# Altium footprint library Inductance.PcbLib: 42 footprints (part 1 of 3)
Each footprint in its own frame and in the unit in brackets; x right, y up, seen from the top. Pads: shape width x height; smd on the part's side, far side on the other; paste and mask are expansions set on the pad; w line width, h text height; cw(c..) or ccw(c..) is an arc to the next point about the centre after c.
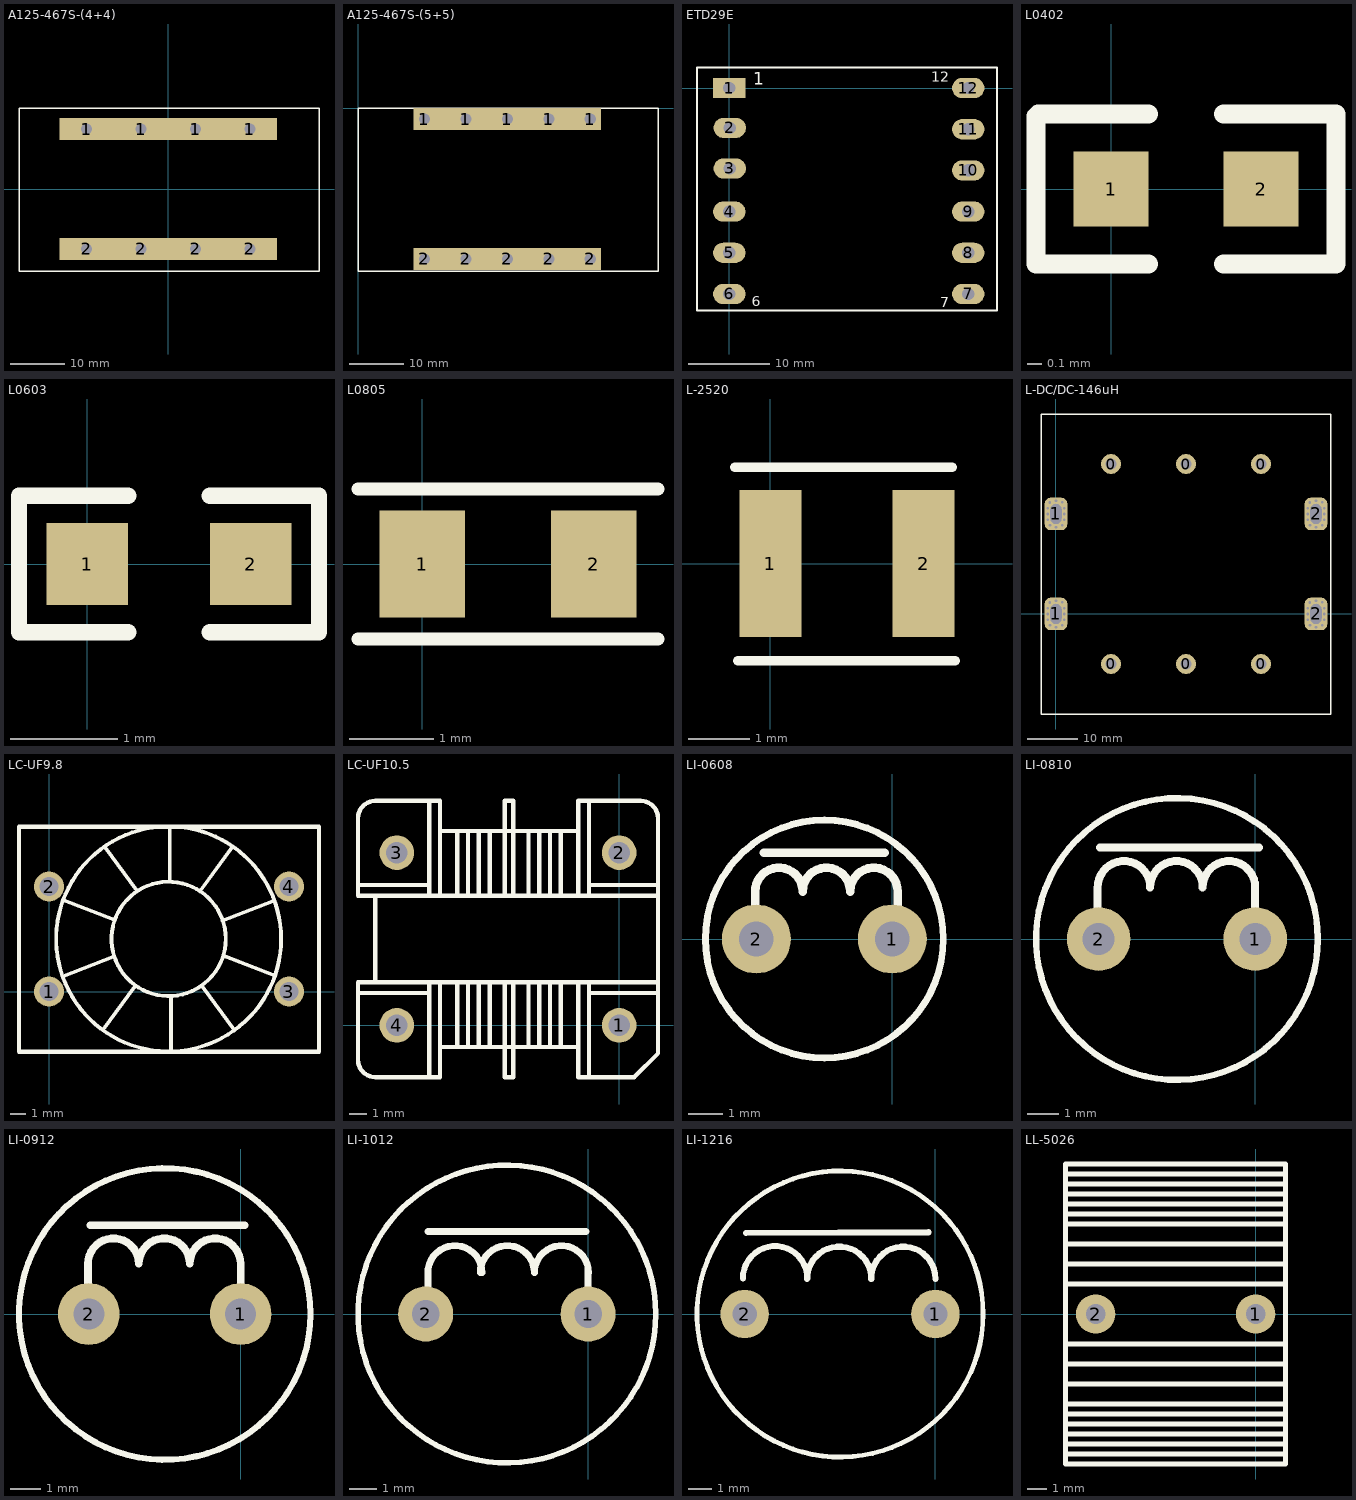
[diagram p0: the footprints below, top view; thin cyan lines are the x and y axes]

## A125-467S-(4+4) [mm]
pads (8):
  rect 10x4.064 hole 2.032: 1(-15,11) 1(-5,11) 1(5,11) 1(15,11) 2(-15,-11) 2(-5,-11) 2(5,-11) 2(15,-11)
Top Overlay:
  lines w0.254: -27.432,-15.113 -27.432,14.859 27.686,14.859 27.686,-15.113 -27.432,-15.113
3D body: height 8, standoff -2, extent -15.597,-11.597 -14.402,-10.399
3D body: height 8, standoff -2, extent -5.615,-11.572 -4.42,-10.374
3D body: height 8, standoff -2, extent 4.393,-11.597 5.588,-10.399
3D body: height 8, standoff -2, extent 14.426,-11.572 15.621,-10.374
3D body: height 8, standoff -2, extent 14.388,10.414 15.584,11.612
3D body: height 8, standoff -2, extent 4.406,10.439 5.601,11.637
3D body: height 8, standoff -2, extent -5.627,10.414 -4.432,11.612
3D body: height 8, standoff -2, extent -15.597,10.399 -14.402,11.597
3D body: height 50.8, standoff 1, extent -24.697,-13.903 25.205,14.097

## A125-467S-(5+5) [mil]
pads (10):
  rect 300x160 hole 80 copper offset 70.87,0: 1(480,-80) 2(480,-1090)
  rect 300x160 hole 80: 1(780,-80) 1(1080,-80) 1(1380,-80) 2(780,-1090) 2(1080,-1090) 2(1380,-1090)
  rect 300x160 hole 80 copper offset -70.87,0: 1(1680,-80) 2(1680,-1090)
Top Overlay:
  lines w10: 0,-1180 2170,-1180 2170,0 0,0 0,-1180
3D body: height 2000.11, standoff 39.37, extent 107.69,-1132.36 2072.31,-30
3D body: height 314.96, standoff -78.74, extent 456.57,-103.57 503.63,-56.42
3D body: height 314.96, standoff -78.74, extent 756.57,-103.57 803.63,-56.42
3D body: height 314.96, standoff -78.74, extent 1056.57,-103.57 1103.63,-56.42
3D body: height 314.96, standoff -78.74, extent 1356.57,-103.57 1403.63,-56.42
3D body: height 314.96, standoff -78.74, extent 1656.57,-103.57 1703.63,-56.42
3D body: height 314.96, standoff -78.74, extent 456.57,-1113.57 503.63,-1066.42
3D body: height 314.96, standoff -78.74, extent 756.57,-1113.57 803.63,-1066.42
3D body: height 314.96, standoff -78.74, extent 1056.57,-1113.57 1103.63,-1066.42
3D body: height 314.96, standoff -78.74, extent 1356.57,-1113.57 1403.63,-1066.42
3D body: height 314.96, standoff -78.74, extent 1656.57,-1113.57 1703.63,-1066.42

## ETD29E [mm]
pads (12):
  rect 4x2.5 hole 1.524: 1(0,0)
  oval 4x2.5 hole 1.524: 2(0.064,-4.92) 3(0.064,-9.92) 4(0,-15.24) 5(0,-20.32) 6(0,-25.4) 7(29.464,-25.4) 8(29.464,-20.32) 9(29.464,-15.24) 10(29.464,-10.16) 11(29.464,-5.08) 12(29.464,0)
Top Overlay:
  lines w0.254: -3.987,-27.451 -3.987,2.549 33.013,2.549 33.013,-27.451 -3.987,-27.451
  text "12" at 24.892,0.762 h1.27
  text "6" at 2.794,-26.924 h1.27
  text "7" at 26.035,-27.051 h1.27
  text "1" at 2.921,0.381 h1.52
3D body: height 3, standoff -2, extent 28.966,-0.49 29.962,0.508
3D body: height 3, standoff -2, extent 28.966,-5.588 29.962,-4.59
3D body: height 3, standoff -2, extent 28.976,-10.659 29.972,-9.661
3D body: height 3, standoff -2, extent 28.976,-15.739 29.972,-14.741
3D body: height 3, standoff -2, extent 28.981,-20.819 29.977,-19.821
3D body: height 3, standoff -2, extent 28.966,-25.908 29.962,-24.91
3D body: height 3, standoff -2, extent -0.488,-25.899 0.508,-24.901
3D body: height 3, standoff -2, extent -0.488,-20.819 0.508,-19.821
3D body: height 3, standoff -2, extent -0.498,-15.748 0.498,-14.75
3D body: height 3, standoff -2, extent -0.437,-10.43 0.559,-9.432
3D body: height 3, standoff -2, extent -0.432,-5.427 0.564,-4.429
3D body: height 3, standoff -2, extent -0.488,-0.499 0.508,0.499
3D body: height 10, standoff 3, extent 27.178,-27.432 30.734,2.54
3D body: height 10, standoff 3, extent -1.27,-27.432 2.286,2.54
3D body: height 20, standoff 10, extent 27.178,-27.432 30.734,2.54
3D body: height 20, standoff 10, extent -1.27,-27.432 30.734,-26.035
3D body: height 20, standoff 10, extent -1.27,-27.432 2.286,2.54
3D body: height 20, standoff 10, extent -1.27,1.143 30.734,2.54
3D body: height 23.3, standoff -1.4, extent 2.354,-25.946 27.105,1.054

## L0402 [mil] "贴片电感"
pads (2):
  rect 20x20 smd: 1(0,0) 2(40,0)
Top Overlay:
  lines w5: 10,-20 -20,-20 -20,19.37 -19.37,20 10,20 ; 30,-20 60,-20 60,-5 60,20 30,20
3D body "C0402.STEP": height 19.84, standoff 0.16, extent 0.32,-10 39.69,10.08

## L0603 [mil]
pads (2):
  rect 30x30 smd: 1(0,0) 2(60,0)
Top Overlay:
  lines w6: 15,-25 -25,-25 -25,25 15,25 ; 45,-25 85,-25 85,25 45,25
3D body "EMIFIL_0603.STEP": height 23.77, standoff 0, extent -1.5,-15 61.5,17.22

## L0805 [mil]
pads (2):
  rect 40x50 smd: 1(0,0) 2(80,0)
Top Overlay:
  lines w6: -30,-35 60,-35 110,-35 ; -30,35 60,35 110,35
3D body "R0805.STEP": height 21.65, standoff 0, extent 0.63,-25 79.37,24.61

## L-2520 [mm] "10uH 叠层电感，700mA"
height 1.6
pads (2):
  rect 1.016x2.4 smd: 1(0,0) 2(2.5,0)
Top Overlay:
  lines w0.152: -0.586,1.575 1.7,1.575 2.97,1.575 ; -0.537,-1.589 1.749,-1.589 3.019,-1.589
3D body: height 2, standoff 0, extent 0.275,-0.65 2.275,0.61

## L-DC/DC-146uH [mm]
pads (10):
  round 4 hole 2.2: 0(11,-10) 0(11,30) 0(26,-10) 0(26,30) 0(41,-10) 0(41,30)
  rrect50% 4.5x6.5 hole 2.2 slot 4 at 90 deg: 1(0,0) 1(0,20) 2(52,0) 2(52,20)
via -1.675,0 diameter 1.016 hole 0.508
via 1.675,0 diameter 1.016 hole 0.508
via 0,2.625 diameter 1.016 hole 0.508
via 0,-2.625 diameter 1.016 hole 0.508
via -1.675,1.125 diameter 1.016 hole 0.508
via -1.25,2.3 diameter 1.016 hole 0.508
via 1.25,2.325 diameter 1.016 hole 0.508
via 1.675,1.125 diameter 1.016 hole 0.508
via 1.675,-1.125 diameter 1.016 hole 0.508
via 1.25,-2.25 diameter 1.016 hole 0.508
via -1.2,-2.225 diameter 1.016 hole 0.508
via -1.675,-1.125 diameter 1.016 hole 0.508
via -1.675,18.875 diameter 1.016 hole 0.508
via -1.2,17.775 diameter 1.016 hole 0.508
via 1.25,17.75 diameter 1.016 hole 0.508
via 1.675,18.875 diameter 1.016 hole 0.508
via 1.675,21.125 diameter 1.016 hole 0.508
via 1.25,22.325 diameter 1.016 hole 0.508
via -1.25,22.3 diameter 1.016 hole 0.508
via -1.675,21.125 diameter 1.016 hole 0.508
via 0,17.375 diameter 1.016 hole 0.508
via 0,22.625 diameter 1.016 hole 0.508
via 1.675,20 diameter 1.016 hole 0.508
via -1.675,20 diameter 1.016 hole 0.508
via 50.325,18.875 diameter 1.016 hole 0.508
via 50.8,17.775 diameter 1.016 hole 0.508
via 53.25,17.75 diameter 1.016 hole 0.508
via 53.675,18.875 diameter 1.016 hole 0.508
via 53.675,21.125 diameter 1.016 hole 0.508
via 53.25,22.325 diameter 1.016 hole 0.508
via 50.75,22.3 diameter 1.016 hole 0.508
via 50.325,21.125 diameter 1.016 hole 0.508
via 52,17.375 diameter 1.016 hole 0.508
via 52,22.625 diameter 1.016 hole 0.508
via 53.675,20 diameter 1.016 hole 0.508
via 50.325,20 diameter 1.016 hole 0.508
via 50.325,-1.125 diameter 1.016 hole 0.508
via 50.8,-2.225 diameter 1.016 hole 0.508
via 53.25,-2.25 diameter 1.016 hole 0.508
via 53.675,-1.125 diameter 1.016 hole 0.508
via 53.675,1.125 diameter 1.016 hole 0.508
via 53.25,2.325 diameter 1.016 hole 0.508
via 50.75,2.3 diameter 1.016 hole 0.508
via 50.325,1.125 diameter 1.016 hole 0.508
via 52,-2.625 diameter 1.016 hole 0.508
via 52,2.625 diameter 1.016 hole 0.508
via 53.675,0 diameter 1.016 hole 0.508
via 50.325,0 diameter 1.016 hole 0.508
Top Overlay:
  lines w0.254: -3,-20 55,-20 55,40 -3,40 -3,0 -3,-20
3D body: height 0, standoff -5, extent 51.202,18.506 52.798,20.1
3D body: height 0, standoff -5, extent 51.202,20.106 52.798,21.7
3D body: height 0, standoff -5, extent 51.202,-1.494 52.798,0.1
3D body: height 0, standoff -5, extent 51.202,0.006 52.798,1.6
3D body: height 0, standoff -5, extent -0.798,-1.494 0.798,0.1
3D body: height 0, standoff -5, extent -0.798,-0.094 0.798,1.5
3D body: height 0, standoff -5, extent -0.798,18.406 0.798,20
3D body: height 0, standoff -5, extent -0.798,20.106 0.798,21.7
3D body: height 0, standoff -5, extent 40.202,-10.794 41.798,-9.2
3D body: height 0, standoff -5, extent 25.202,-10.794 26.798,-9.2
3D body: height 0, standoff -5, extent 10.202,-10.794 11.798,-9.2
3D body: height 0, standoff -5, extent 40.202,29.206 41.798,30.8
3D body: height 0, standoff -5, extent 25.202,29.206 26.798,30.8
3D body: height 0, standoff -5, extent 10.202,29.206 11.798,30.8
3D body: height 1, standoff 0, extent -3.127,-20.127 55.127,40.127
3D body: height 59.77, standoff 1, extent 1,-19.4 51,39.484
3D body: height 0, standoff -5, extent -0.798,19.906 0.798,21.5
3D body: height 0, standoff -5, extent -0.798,18.506 0.798,20.1
3D body: height 0, standoff -5, extent 51.202,19.906 52.798,21.5
3D body: height 0, standoff -5, extent 51.202,18.506 52.798,20.1
3D body: height 0, standoff -5, extent 51.202,-0.094 52.798,1.5
3D body: height 0, standoff -5, extent 51.202,-1.494 52.798,0.1

## LC-UF9.8 [mm]
pads (4):
  round 2 hole 1.27: 1(0,0) 2(0,7) 3(16,0) 4(16,7)
Top Overlay:
  circle w0.254: c7.976,3.513 r3.81
  circle w0.254: c7.976,3.513 r7.5
  lines w0.254: 0.94,1.024 4.293,2.319 ; 0.991,6.079 4.343,4.783 ; 3.607,-2.557 5.74,0.364 ; 3.734,9.635 5.867,6.714 ; 8.052,7.323 8.052,10.93 ; 8.128,-3.98 8.128,-0.373 ; 10.109,6.739 12.243,9.66 ; 10.236,0.338 12.37,-2.583 ; 11.557,4.732 14.91,6.028 ; 11.735,2.345 15.088,1.049
  lines w0.3: -2,-4 -2,11 18,11 18,-4 -2,-4
3D body: height 3.8, standoff 3.2, extent 14.307,7.202 16.307,7.8
3D body: height 3.8, standoff 3.2, extent 14.307,-0.774 16.307,-0.175
3D body: height 3.8, standoff 3.2, extent -0.298,-0.799 1.702,-0.201
3D body: height 3.8, standoff 3.2, extent -0.324,7.202 1.676,7.8
3D body: height 10, standoff 0, extent 0.528,-3.947 15.469,11.024
3D body: height 3.5, standoff 0, extent -0.324,7.196 0.273,7.795
3D body: height 3.5, standoff 0, extent -0.299,-0.794 0.299,-0.195
3D body: height 3.5, standoff 0, extent 15.703,-0.779 16.301,-0.181
3D body: height 3.5, standoff 0, extent 15.709,7.202 16.307,7.8

## LC-UF10.5 [mil]
pads (4):
  round 80 hole 50: 1(0,0) 2(0,400) 3(-515,400) 4(-515,0)
Top Overlay:
  lines w10: -605,75 -445,75 ; -600,325 -440,325 ; -440,-120 -440,100 ; -440,300 -440,520 ; -415,100 -415,-50 ; -415,300 -415,450 ; -375,-50 -375,100 ; -375,300 -375,450 ; -350,-50 -350,100 ; -350,300 -350,450 ; -325,-50 -325,100 ; -325,300 -325,450 ; -300,-50 -300,100 ; -300,300 -300,450 ; -265,100 -265,-120 -245,-120 -245,100 ; -265,300 -265,520 -245,520 -245,300 ; -210,-50 -210,100 ; -210,300 -210,450 ; -185,-50 -185,100 ; -185,300 -185,450 ; -160,-50 -160,100 ; -160,300 -160,450 ; -135,-50 -135,100 ; -135,300 -135,450 ; -95,100 -95,-50 ; -95,300 -95,450 ; -70,-120 -70,100 ; -70,75 90,75 ; -70,300 -70,520 ; -70,325 90,325 ; 90,100 -565,100 ; 90,300 -565,300 ; -565,100 -565,300 ; -565,100 -605,100 -605,-80 ccw(c-565,-80) -565,-120 -415,-120 -415,-50 ; -565,300 -605,300 -605,480 cw(c-565,480) -565,520 -415,520 -415,450 ; -415,-50 -95,-50 ; -415,450 -95,450 ; -95,-50 -95,-120 35,-120 90,-65 90,480 ccw(c50,480) 50,520 -95,520 -95,450
3D body: height 118.11, standoff 0, extent -610,-120 -450,525
3D body: height 708.66, standoff 0, extent -70,-120 35,525
3D body: height 708.66, standoff 0, extent -570,-120 -440,520
3D body: height 629.92, standoff 159.34, extent -230,-25 -111.89,446.51
3D body: height 629.92, standoff 159.34, extent -394.06,-36.51 -275.94,435
3D body: height 118.11, standoff 0, extent -70,-120 90,525
3D body: height 118.11, standoff 0, extent -535,-120 -440,520
3D body: height 826.77, standoff 708.66, extent -565,100 90,300
3D body: height 708.66, standoff 0, extent -90,-120 -70,520
3D body: height 708.66, standoff 0, extent -435,-120 -415,520
3D body: height 708.66, standoff 0, extent -265,-120 -245,520
3D body: height 0, standoff -196.85, extent -530,380 -500,420
3D body: height 0, standoff -196.85, extent -15,380 15,420
3D body: height 0, standoff -196.85, extent -15,-20 15,20
3D body: height 0, standoff -196.85, extent -530,-20 -500,20

## LI-0608 [mil]
pads (2):
  round 80 hole 40: 1(0,0) 2(-157.48,0)
Top Overlay:
  circle w8: c-78.74,0 r137.8
  lines w10: -158.86,55 cw(c-131.3,55) -103.74,55 ; -158.74,-5 -158.74,55 ; -148.74,100 -8.74,100 ; -103.86,55 cw(c-76.3,55) -48.74,55 ; -48.86,55 cw(c-21.3,55) 6.26,55 6.26,-5
3D body: height 413.39, standoff 19.68, extent -214.7,-136.52 59.8,138.53
3D body: height 19.68, standoff -39.37, extent -15.62,-15.71 15.75,15.72
3D body: height 19.68, standoff -39.37, extent -173.09,-15.71 -141.73,15.73

## LI-0810 [mil]
pads (2):
  round 80 hole 40: 1(0,0) 2(-196.85,0)
Top Overlay:
  circle w8: c-98.43,0 r177.17
  lines w10: -198,5 -198,65 cw(c-165,65) -132,65 cw(c-99,65) -66,65 cw(c-33,65) 0,65 0,5 ; -195,115 5,115
3D body: height 19.68, standoff -39.37, extent -213,-15.72 -181.63,15.72
3D body: height 19.68, standoff -39.37, extent -15.37,-15.72 16,15.72
3D body: height 492.13, standoff 19.68, extent -274.93,-175.82 78,177.82

## LI-0912 [mil]
pads (2):
  round 80 hole 40: 1(0,0) 2(-196.85,0)
Top Overlay:
  circle w8: c-98.43,0 r188.98
  lines w10: -198,5 -198,65 cw(c-165,65) -132,65 cw(c-99,65) -66,65 cw(c-33,65) 0,65 0,5 ; -195,115 5,115
3D body: height 19.68, standoff -39.37, extent -213,-15.72 -181.63,15.72
3D body: height 19.68, standoff -39.37, extent -15.37,-15.72 16,15.72
3D body: height 492.13, standoff 19.68, extent -274.93,-175.82 78,177.82

## LI-1012 [mil]
pads (2):
  round 80 hole 40: 1(0,0) 2(-236.22,0)
Top Overlay:
  circle w8: c-118.11,0 r216.54
  lines w10: -233.11,120 -3.11,120 ; -233,5 -233,65 ; -233,60 cw(c-193.63,60) -154.26,60 ; -156.85,60 cw(c-117.48,60) -78.11,60 cw(c-38.74,60) 0.63,60 ; 0,5 0,65
3D body: height 19.68, standoff -39.37, extent -252.37,-15.72 -221,15.72
3D body: height 19.68, standoff -39.37, extent -15.37,-15.72 16,15.72
3D body: height 570.87, standoff 19.68, extent -333.68,-216 97.68,216.22

## LI-1216 [mil]
pads (2):
  round 80 hole 40: 1(0,0) 2(-314.96,0)
Top Overlay:
  circle w8: c-157.48,0 r236.22
  lines w10: -318,59 cw(c-264.85,59) -211.7,59 ; -312.48,134 -11.48,135 ; -212,58 cw(c-158.85,58) -105.7,58 ; -106.3,58 cw(c-53.15,58) 0,58
3D body: height 688.98, standoff 19.68, extent -393.06,-234.51 77.52,237
3D body: height 19.68, standoff -39.37, extent -15.37,-15.72 16,15.72
3D body: height 19.68, standoff -39.37, extent -330.37,-15.72 -299,15.72

## LL-5026 [mm]
pads (2):
  round 2 hole 1: 1(-0.013,0.006) 2(-8.141,0.006)
Top Overlay:
  lines w0.254: -9.665,-7.106 1.511,-7.106 ; -9.665,-6.598 1.511,-6.598 ; -9.665,-6.09 1.511,-6.09 ; -9.665,-5.582 1.511,-5.582 ; -9.665,-5.074 1.511,-5.074 ; -9.665,-4.566 1.511,-4.566 ; -9.665,-3.55 1.511,-3.55 ; -9.665,-2.534 1.511,-2.534 ; -9.665,-1.518 1.511,-1.518 ; -9.665,1.53 1.511,1.53 ; -9.665,2.546 1.511,2.546 ; -9.665,3.562 1.511,3.562 ; -9.665,4.578 1.511,4.578 ; -9.665,5.086 1.511,5.086 ; -9.665,5.594 1.511,5.594 ; -9.665,6.102 1.511,6.102 ; -9.665,6.61 1.511,6.61 ; -9.665,7.118 1.511,7.118 ; -9.665,-7.614 -9.665,7.626 1.511,7.626 1.511,-7.614 -9.665,-7.614
3D body: height 15.44, standoff 0.5, extent -9.06,-7.46 0.94,7.511
3D body: height 0.5, standoff -1, extent -8.458,-0.299 -7.861,0.299
3D body: height 0.5, standoff -1, extent -0.305,-0.299 0.293,0.299